# Altium schematic symbol library LimeMicroAltiumLib.SchLib: 590 symbols (part 11 of 13) (continued)
## Qorvo_Duplexers_QPQ1270_QPQ1282_QPQ1297
designator IC?, comment Duplexer
Manufacturer: Qorvo; Supplier 1: Qorvo; Manufacturer Part Number 1: *; Supplier Part Number 1: *
footprint Qorvo_QPQ_duplexer (QPQ1270, QPQ1282, QPQ1297 BAW duplexers)
pins: 1 DL (io), 2 GND, 3 UL (io), 4 GND, 5 GND, 6 ANT (io), 7 GND, 8 GND, 9 GND

## QPA4563A_RF_amplifier
designator IC?, comment QPA4563A
Part Description: RF Amplifier DC-3.5GHZ NF 2.5dB Gain 20.4dB; Manufacturer: Qorvo; Manufacturer Part Number 1: QPA4563ATR7; Supplier 1: Mouser; Supplier Part Number 1: 772-QPA4563ATR7; Stock 1: 25830; Pricing 1: 1=2,72000, 10=2,72000, 50=1,97000, 100=1,60000, 1000=0,89000, 10000=0,88700 (USD); RoHS: Yes; RoHS Compliant: Yes
footprint QPA4563ATR7_SOT363-6
pins: 1 GND, 2 GND, 3 RF IN (in), 4 GND, 5 GND, 6 RF OUT/BIAS (out)

## QPA9119
designator IC?
0.5W High Linearity Amplifier; Manufacturer: Qorvo; Part Description: 0.5W High Linearity Amplifier; Manufacturer Part Number 1: QPA9119; Supplier 1: Qorvo; Supplier Part Number 1: QPA9119
footprint QPA9119_QFN3X3-16 (Quad Flat No Lead, Plastic; 16 Terminals; Body 3 x 3 mm; Pitch 0.5 mm)
pins: 1 NC hidden, 2 RF_IN (in), 3 RF_IN (in), 4 NC hidden, 5 NC hidden, 6 NC hidden, 7 NC hidden, 8 NC hidden, 9 NC hidden, 10 RF_OUT (out), 11 RF_OUT (out), 12 NC hidden, 13 NC hidden, 14 NC hidden, 15 IREF (power), 16 NC hidden, PAD GND

## QPA9426
designator IC?
Manufacturer Part Number 1: QPA9426SR; Part Description: RF Amplifier 2.5-2.7GHz Gain 34dB PAE 14%; Supplier Part Number 1: 772-QPA9426SR; Supplier 1: Mouser
footprint QPA9426_SMD-14
pins: 1 Vref (in), 2 GND, 3 GND, 4 VCC1 (power), 5 RFin (in), 6 GND, 7 NC, 8 GND, 9 GND, 10 GND, 11 VCC2 (power), 12 RFout (out), 13 GND, 14 GND, PAD RF/DC GND

## QPB9337TR13
designator IC?, comment QPB9337
RF Front End 1.8-3.8 GHz Dual Channel Switch LNA Module; Manufacturer: Qorvo; Manufacturer Part Number 1: QPB9337TR13; Supplier 1: Mouser; Stock 1: 200; Pricing 1: 1 = 28,65000, 10 = 28,65000, 50 = 21,86000, 100 = 17,07000, 1000 = 17,07000, 10000 = 17,07000 (USD); Supplier Part Number 1: 772-QPB9337TR13; Part Description: RF Front End 1.8-3.8 GHz Dual Channel Switch LNA Module
footprint QPB9337_QFN32
part A pins: 2 RX-M (out), 7 RX-D (out), 9 BP-D (in), 12 EN-D (in), 16 ANT-D (in), 18 TX-D (out), 23 TX-M (out), 25 ANT-M (in), 29 EN-M (in), 32 BP-M (in)
part B pins: 1 VDD2-M (power), 3 GND, 4 GND, 5 GND, 6 GND, 8 VDD2-D (power), 10 GND, 11 VDD1-D (power), 13 GND, 14 GND, 15 GND, 17 GND, 19 VDD-D (power), 20 GND, 21 GND, 22 VDD-M (power), 24 GND, 26 GND, 27 GND, 28 GND, 30 VDD1-M (power), 31 GND, 32 PAD
part A text: LNA-M; LNA-D

## RAKON_E8231LF_E6982LF
designator XO?, comment E6982LF
Part Description: 26MHz E6982LF Small Cell TCVCXO, w EN and VC, L x W: 5.0 x 3.2 mm nom., H: 2.1 mm max. (6 pad); Manufacturer: Rakon; Manufacturer Part Number 1: E6982LF; Supplier Part Number 1: E6982LF; Supplier 1: Rakon
footprint RAKON_E8231LF_E6982LF (RAKON RTX5032A 40MHz Filter enabled, with VC, 10pin 5mm x 3.2mm)
pins: 1 DNC/VC (in), 2 GND, 3 DNC/VREF/VTEMP (in), 4 RF OUT (out), 5 VCC (power), 6 EN (in)

## Rakon_RTX5032A
designator XO?, comment RTX5032A, 40MHz, w VC, w Filter
Part Description: RTX5032A 40MHz, High performance TCXO, With VC, Filter Enabled, 10-pin 5mm x 3.2 mm x 1.65 mm package; Manufacturer: Rakon; Manufacturer Part Number 1: RTX5032A; Supplier Part Number 1: RTX5032A; Supplier 1: RAKON
footprint RAKON_RTX5032A (RAKON RTX5032A 40MHz Filter enabled, without VC, 10pin)
pins: 1 VCO (in), 2 NC, 3 NC, 4 GND, 5 NC, 6 RF OUT (out), 7 VC FILTER (in), 8 NC, 9 VCC (power), 10 NC

## Raspberry_RPI-COMPUTE3
designator PC?, comment RPI-COMPUTE3  (mechanical)
Part Description: RPI-COMPUTE3 -  Development Kit, Raspberry Pi Compute Module 3, DDR2-SODIMM Mechanically Compatible SoM, 1GB RAM; Manufacturer: RASPBERRY-PI; Manufacturer Part Number 1: RPI-COMPUTE3; Supplier 1: Farnell; Supplier Part Number 1: 2675716

## RBP-140+
designator IC?
Manufacturer: Minicircuits; Part Description: 130 to 150 MHz 50R bandpass filter; Supplier 1: Minicircuits; Supplier Part Number 1: RBP-140+; Manufacturer Part Number 1: RBP-140+
footprint RBP-140+ (saw filter, case style GP731)
pins: 1 GND, 2 Input (in), 3 GND, 4 GND, 5 GND, 6 Output (out), 7 GND, 8 GND

## RCBT-63+
designator IC?
Surface mount bias-tee, wideband; Manufacturer_Name: Mini-Circuits; Manufacturer_Part_Number: RCBT-63+; Supplier Part Number 1: RCBT-63+; Supplier 1: Mini-Circuits; Part Description: Surface mount bias-tee, wideband
pins: 1 DC (io), 2 NC, 3 RF (io), 4 RF&DC (io), 5 NC, 6 NC

## RCIL05A_LRF_isolator
designator IC?, comment RCIL05AL
Manufacturer: RFC; Part Description: RF isolator for LTE band, SMD, 5mm x 5.15mm; Manufacturer Part Number 1: RCIL05AL; Supplier Part Number 1: *; Supplier 1: *
footprint RCIL05AL_RF_isolator
pins: 1 G, 2 G, 3 P1 (in), 4 P2 (out), 5 G, 6 G, PAD
text: Port1; Port2

## RCIL05AL_L_P1toP2_RF_isolator
designator IC?, comment RCIL05AL
Manufacturer: RFC; Part Description: RF isolator for LTE band, SMD, 5mm x 5.15mm; Manufacturer Part Number 1: RCIL05AL; Supplier Part Number 1: *; Supplier 1: *
footprint RCIL05AL_P1toP2_RF_isolator
pins: 1 G, 2 G, 3 P1 (in), 4 P2 (out), 5 G, 6 G, PAD
text: Port1; Port2

## RCIL05AL_R_P2toP1_RF_isolator
designator IC?, comment RCIL05AL
Manufacturer: RFC; Part Description: RF isolator for LTE band, SMD, 5mm x 5.15mm; Manufacturer Part Number 1: RCIL05AL; Supplier Part Number 1: *; Supplier 1: *
footprint RCIL05AL_P2toP1_RF_isolator
pins: 1 G, 2 G, 3 P1 (out), 4 P2 (in), 5 G, 6 G, PAD
text: Port2; Port1

## Res_0201
designator R?
value: *
pins: 1, 2

## Res_0402
designator R?
Value: *
footprint RES0402 (Chip Resistor, Body 1.0x0.5mm, EIA 0402, IPC Medium Density)
pins: 1, 2

## Res_0603
designator R?
Value: *
footprint RES0603 (Chip Resistor, Body 1.6x0.8mm, 0603, IPC Medium Density)
pins: 1, 2

## Res_0805
designator R?
Value: *
footprint RES0805 (Chip Resistor, Body 2.0x1.2mm, 0805, IPC Medium Density)
pins: 1, 2

## ResArray_0802
designator R?, comment 22R
Temperature Coefficient: ±200ppm/°C; Tolerance: ±5%; Supplier 1: Digi-Key; Supplier Part Number 1: YC124J-22TR-ND; Package / Case: 0804, Convex, Long Side Terminals; Value: 22R
footprint ChipResistorArray (Chip Array, Flat, 8-Leads, Pitch 0,60mm,  Body 2,05x1,05mm,  IPC Medium Density)
part A pins: 1, 2
part B pins: 3, 4
part C pins: 5, 6
part D pins: 7, 8

## ResArray_0802v2
designator R?, comment 22R
Manufacturer Part Number 1: YC124-JR-0722RL; Temperature Coefficient: ±200ppm/°C; Tolerance: ±5%; Supplier 1: Digi-Key; Supplier Part Number 1: YC124J-22TR-ND; Package / Case: 0804, Convex, Long Side Terminals; Value: 22R
footprint ChipResistorArray (Chip Array, Flat, 8-Leads, Pitch 0,60mm,  Body 2,05x1,05mm,  IPC Medium Density)
pins: 1, 2, 3, 4, 5, 6, 7, 8

## RF_circulator_CCW
designator HY?
footprint RF_circulator_CCW
pins: GND, P1 (power), P2 (power), P3 P1 (power)
text: CCW

## RF_circulator_CW
designator HY?
footprint RF_circulator_CW
pins: GND, P1 (power), P2 (power), P3 P1 (power)
text: CW

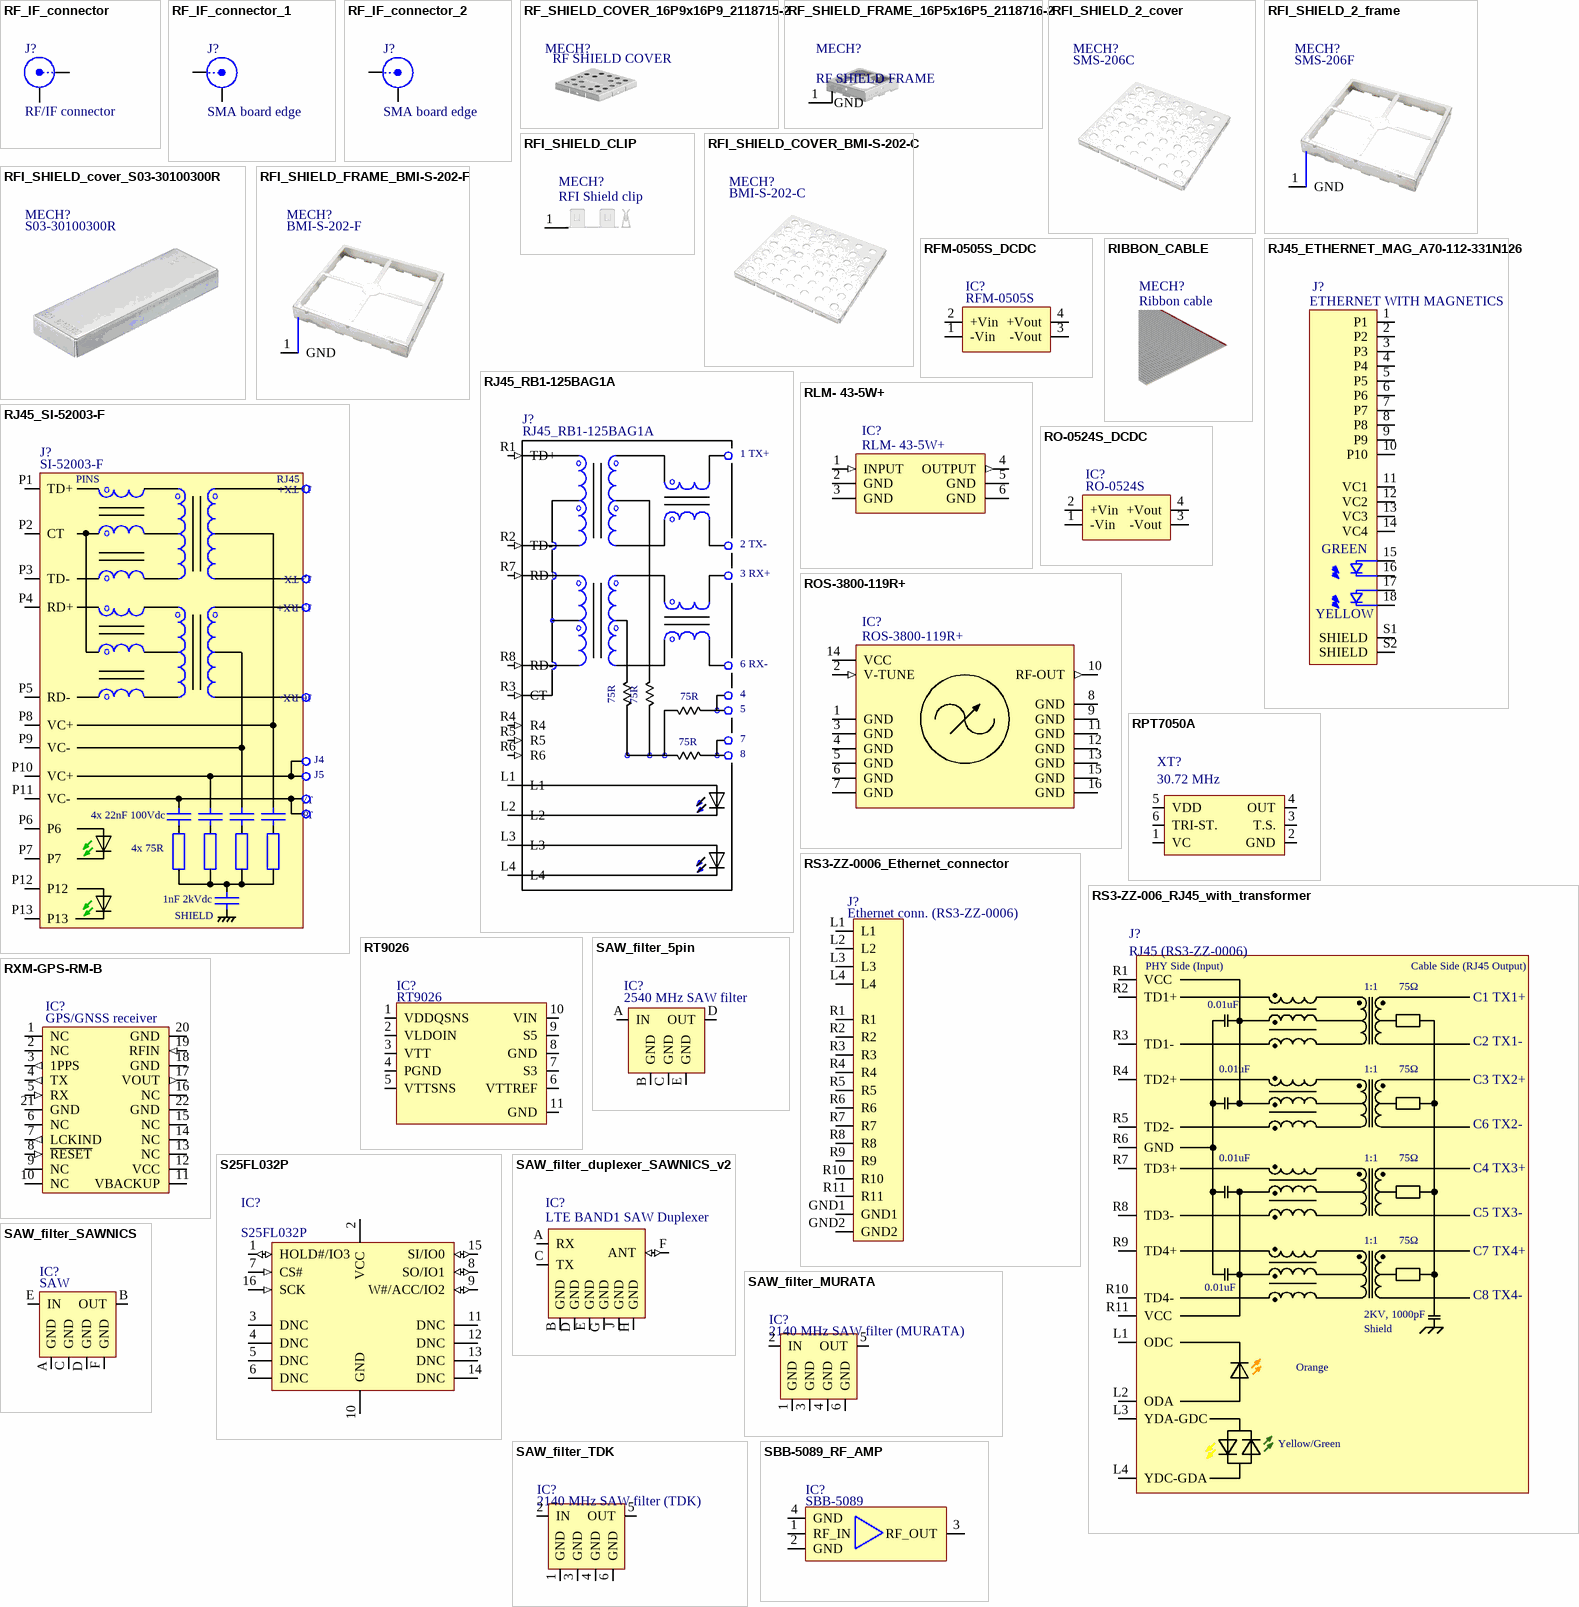
[diagram p62: symbols RF_IF_connector to SBB-5089_RF_AMP]

## RF_IF_connector
designator J?, comment RF/IF connector
footprint MMCX_conn
pins: 1 X, 2 Y

## RF_IF_connector_1
designator J?, comment SMA board edge
CONN SMA JACK STR 50OHM EDGE MNT; Manufacturer: RF Solutions; Manufacturer Part Number 1: CON-SMA-EDGE-S; Part Description: SMA Connector Jack, Female Socket Board Edge, End Launch Solder; Connector Type: Jack, Female Socket; Contact Termination: Solder; Supplier 1: Digi-Key; Supplier Part Number 1: CON-SMA-EDGE-S-ND; RoHS: RoHS Compliant; Category: Connectors, Interconnects; Stock 1: 1751; Pricing 1: 1=2.1 (USD); Packaging: -; Part Status: Active; Connector Style: SMA; Shield Termination: Solder; Impedance: -; Mounting Type: Board Edge, End Launch; Mounting Feature: -; Cable Group: -; Fastening Type: Threaded; Frequency - Max: -; Features: -; Housing Color: -; Ingress Protection: -; Includes: -; Body Material: -; Body Finish: -; Center Contact Plating: -; Dielectric Material: -; Operating Temperature: -; Center Contact Material: -; Voltage Rating: -; Mating Cycles: -; Insertion Loss: -; ComponentLink1URL: http://media.digikey.com/pdf/Data%20Sheets/RF%20Solutions%20PDFs/CON-SMA-EDGE.pdf; ComponentLink1Description: http://media.digikey.com/pdf/Data%20Sheets/RF%20Solutions%20PDFs/CON-SMA-EDGE.pdf
footprint MMCX_UFL_conn_u
footprint SMA_connector_board_edge_SM
footprint MMCX_UFL_conn_V4_M
pins: 1 X, 2 Y

## RF_IF_connector_2
designator J?, comment SMA board edge
CONN SMA JACK STR 50OHM EDGE MNT; Manufacturer: RF Solutions; Manufacturer Part Number 1: CON-SMA-EDGE-S; Part Description: SMA Connector Jack, Female Socket Board Edge, End Launch Solder; Connector Type: Jack, Female Socket; Contact Termination: Solder; Supplier 1: Digi-Key; Supplier Part Number 1: CON-SMA-EDGE-S-ND; RoHS: RoHS Compliant; Category: Connectors, Interconnects; Stock 1: 1751; Pricing 1: 1=2.1 (USD); Packaging: -; Part Status: Active; Connector Style: SMA; Shield Termination: Solder; Impedance: -; Mounting Type: Board Edge, End Launch; Mounting Feature: -; Cable Group: -; Fastening Type: Threaded; Frequency - Max: -; Features: -; Housing Color: -; Ingress Protection: -; Includes: -; Body Material: -; Body Finish: -; Center Contact Plating: -; Dielectric Material: -; Operating Temperature: -; Center Contact Material: -; Voltage Rating: -; Mating Cycles: -; Insertion Loss: -; ComponentLink1URL: http://media.digikey.com/pdf/Data%20Sheets/RF%20Solutions%20PDFs/CON-SMA-EDGE.pdf; ComponentLink1Description: http://media.digikey.com/pdf/Data%20Sheets/RF%20Solutions%20PDFs/CON-SMA-EDGE.pdf
footprint MMCX_UFL_conn_u
footprint SMA_connector_board_edge_SM
footprint MMCX_UFL_conn_V4_M
pins: 1 X, 2 Y

## RF_SHIELD_COVER_16P9x16P9_2118715-2
designator MECH?, comment RF SHIELD COVER
Part Description: RF Shield Cover 0.665" (16.90mm) X 0.665" (16.90mm) Vented Surface Mount; Manufacturer: TE Connectivity; Manufacturer Part Number 1: 2118715-2; ComponentLink1URL: https://www.te.com/commerce/DocumentDelivery/DDEController?Action=srchrtrv&DocNm=2118716&DocType=Customer+Drawing&DocLang=English&src-supplier=Digi-Key; ComponentLink1Description: https://www.te.com/commerce/DocumentDelivery/DDEController?Action=srchrtrv&DocNm=2118716&DocType=Customer+Drawing&DocLang=English&src-supplier=Digi-Key; Supplier 1: Digi-Key; Supplier Part Number 1: A126120-ND; Stock 1: 58094; Pricing 1: 1=1,44000, 10=1,28900, 25=1,22400, 100=1,00530, 250=0,93972, 500=0,83046, 1000=0,65562, 2500=0,61191, 5000=0,58132 (USD); RoHS: Yes; ComponentLink2URL: https://www.te.com/commerce/DocumentDelivery/DDEController?Action=srchrtrv&DocNm=2118715&DocType=Customer+Drawing&DocLang=English&src-supplier=Digi-Key; ComponentLink2Description: https://www.te.com/commerce/DocumentDelivery/DDEController?Action=srchrtrv&DocNm=2118715&DocType=Customer+Drawing&DocLang=English&src-supplier=Digi-Key
footprint RF_SHIELD_COVER_16Px916P9_2118715-2

## RF_SHIELD_FRAME_16P5x16P5_2118716-2
designator MECH?, comment RF SHIELD FRAME
Part Description: RF Shield Frame 0.650" (16.50mm) X 0.650" (16.50mm) Surface Mount; Manufacturer: TE Connectivity; Manufacturer Part Number 1: 2118716-2; Supplier 1: Digi-Key; Supplier Part Number 1: A126152CT-ND; Stock 1: 26553; Pricing 1: 1=0,93000, 10=0,81600, 25=0,76680, 100=0,62570, 250=0,58120 (USD); RoHS: Yes; ComponentLink1URL: https://www.te.com/commerce/DocumentDelivery/DDEController?Action=srchrtrv&DocNm=2118716&DocType=Customer+Drawing&DocLang=English&src-supplier=Digi-Key; ComponentLink1Description: https://www.te.com/commerce/DocumentDelivery/DDEController?Action=srchrtrv&DocNm=2118716&DocType=Customer+Drawing&DocLang=English&src-supplier=Digi-Key
footprint RF_SHIELD_FRAME_16P5x16P5_2118716-2 (Footprint not found)
pins: 1 GND

## RFI_SHIELD_2_cover
designator MECH?, comment SMS-206C  (mechanical)
Manufacturer: Leader Tech Inc.; Part Description: RF Shield Cover 1.348" (34.24mm) X 1.472" (37.39mm) Vented Surface Mount; Ventilation: Vented; Supplier 1: Digi-Key; Manufacturer Part Number: SMS-206C; RoHS: RoHS Compliant; Category: RF/IF and RFID; Stock 1: 1529; Pricing 1: 1=0.8, 10=0.703, 25=0.6228, 100=0.5426, 250=0.47224, 500=0.4019, 1000=0.32152, 2500=0.29138, 5000=0.27128 (USD); Packaging: Bulk; Part Status: Active; Type: Cover; Height - Overall: 0.079" (2.01mm); Length - Overall: 1.472" (37.39mm); Width - Overall: 1.348" (34.24mm); Mounting Type: Surface Mount; ComponentLink1URL: https://www.leadertechinc.com/assets/files/EngineeringDrawings/SMS-206.PDF; ComponentLink1Description: https://www.leadertechinc.com/assets/files/EngineeringDrawings/SMS-206.PDF; Supplier Part Number 1: 1798-1188-ND

## RFI_SHIELD_2_frame
designator MECH?, comment SMS-206F
Part Description: RF Shield Frame 1.326" (33.68mm) X 1.450" (36.83mm) Surface Mount; Manufacturer: Leader Tech Inc.; Supplier 1: Digi-Key; Manufacturer Part Number: SMS-206F; RoHS: RoHS Compliant; Category: RF/IF and RFID; Stock 1: 898; Pricing 1: 1=2.97, 10=2.682, 25=2.3948, 100=2.1553 (USD); Packaging: Cut Tape (CT); Part Status: Active; Type: Frame; Height - Overall: 0.200" (5.08mm); Length - Overall: 1.450" (36.83mm); Width - Overall: 1.326" (33.68mm); Ventilation: -; Mounting Type: Surface Mount; ComponentLink1URL: https://www.leadertechinc.com/assets/files/EngineeringDrawings/SMS-206.PDF; ComponentLink1Description: https://www.leadertechinc.com/assets/files/EngineeringDrawings/SMS-206.PDF; Supplier Part Number 1: 1798-1189-1-ND
footprint SHIELD_SMS-206F (RF Shield  Frame+Cover 1.348" (34.24mm) X 1.472" (37.39mm) Vented Surface Mount)
pins: 1 GND

## RFI_SHIELD_CLIP
designator MECH?, comment RFI Shield clip
Manufacturer Part Number 1: S0971-46R; Manufacturer: HARWIN; Part Description: RFI SHIELD CLIP MINI TIN SMD; SVHC: No SVHC (15-Jun-2015); Supplier 1: Farnell; Supplier: Farnell; Length: 5.8; Clip Type: RFI Shield Clip; Clip Diameter: -; Product Range: -; Mounting Hole Dia: -; RoHS: YES; Supplier Part Number 1: 2361677
footprint RFI_SHIELD_CLPS_MINI (RFI SHIELD CLIP MINI TIN SMD, S0971-46R)
pins: 1 GND

## RFI_SHIELD_COVER_BMI-S-202-C
designator MECH?, comment BMI-S-202-C
Part Description: RF Shield Cover 0.668" (16.96mm) X 0.668" (16.96mm) Vent Holes in Pattern Snap Fit; Manufacturer: Laird; ComponentLink1URL: https://www.leadertechinc.com/assets/files/EngineeringDrawings/SMS-206.PDF; ComponentLink1Description: https://www.leadertechinc.com/assets/files/EngineeringDrawings/SMS-206.PDF; Supplier 1: Digi-Key; Supplier Part Number 1: 903-1014-ND; Manufacturer Part Number 1: BMI-S-202-C; Stock 1: 245970; Pricing 1: 1=1,68000, 10=1,51300, 25=1,42760, 100=1,21620, 250=1,14200, 500=0,99924, 1000=0,82795, 2500=0,77085, 5000=0,74230 (USD); RoHS: Yes; Color: Grey; Material: Aluminium; Package Quantity: 1400; Packaging: Bulk; Series: SMT 2 Piece; Length: 16.5mm; Width: 16.5mm; Depth: 3.6mm; ComponentLink2URL: http://www.farnell.com/datasheets/1965028.pdf?src-supplier=Farnell; ComponentLink2Description: http://www.farnell.com/datasheets/1965028.pdf?src-supplier=Farnell; ComponentLink3URL: http://www.mouser.com/ds/2/223/Laird_BMIS_201_210-201562.pdf?src-supplier=Mouser; ComponentLink3Description: http://www.mouser.com/ds/2/223/Laird_BMIS_201_210-201562.pdf?src-supplier=Mouser; ComponentLink4URL: http://www.farnell.com/datasheets/1965028.pdf?src-supplier=Newark; ComponentLink4Description: http://www.farnell.com/datasheets/1965028.pdf?src-supplier=Newark; ComponentLink5URL: http://www.farnell.com/datasheets/1965028.pdf?src-supplier=Element14; ComponentLink5Description: http://www.farnell.com/datasheets/1965028.pdf?src-supplier=Element14; ComponentLink6URL: http://assets.lairdtech.com/home/brandworld/files/Board%20Level%20Shields%20Catalog%20Download.pdf?src-supplier=Digi-Key; ComponentLink6Description: http://assets.lairdtech.com/home/brandworld/files/Board%20Level%20Shields%20Catalog%20Download.pdf?src-supplier=Digi-Key; ComponentLink7URL: http://assets.lairdtech.com/home/brandworld/files/Board%20Level%20Shields%20Catalog%20Download.pdf?src-supplier=Quest; ComponentLink7Description: http://assets.lairdtech.com/home/brandworld/files/Board%20Level%20Shields%20Catalog%20Download.pdf?src-supplier=Quest
footprint BMI-S-202-C_RF_SHIELD_COVER

## RFI_SHIELD_cover_S03-30100300R
designator MECH?, comment S03-30100300R
Part Description: RF Shield CAN 0.394" (10.00mm) X 1.181" (30.00mm) Non-Vented Surface Mount; Manufacturer: Harwin; ComponentLink1URL: https://www.leadertechinc.com/assets/files/EngineeringDrawings/SMS-206.PDF; ComponentLink1Description: https://www.leadertechinc.com/assets/files/EngineeringDrawings/SMS-206.PDF; Supplier 1: Digi-Key; Supplier Part Number 1: 952-S03-30100300RCT-ND; Manufacturer Part Number 1: S03-30100300R; Stock 1: 6493; Pricing 1: 1=1,30000, 10=1,15900, 25=1,10040, 100=0,90390, 250=0,84496 (USD); RoHS: No
footprint SHIELD_S03-30100300R (RF Shield CAN 0.394" (10.00mm) X 1.181" (30.00mm) Non-Vented Surface Mount)

## RFI_SHIELD_FRAME_BMI-S-202-F
designator MECH?, comment BMI-S-202-F
Part Description: RF Shield Frame 0.650" (16.50mm) X 0.650" (16.50mm) Surface Mount; Manufacturer: Laird; ComponentLink1URL: https://www.leadertechinc.com/assets/files/EngineeringDrawings/SMS-206.PDF; ComponentLink1Description: https://www.leadertechinc.com/assets/files/EngineeringDrawings/SMS-206.PDF; Supplier 1: Digi-Key; Supplier Part Number 1: 903-1051-1-ND; Manufacturer Part Number 1: BMI-S-202-F; Stock 1: 239502; Pricing 1: 1=1,94000, 10=1,74100, 25=1,64280, 100=1,39970, 250=1,31428 (USD); RoHS: Yes; Mount: Solder; Material: Aluminium; Color: Grey; Package Quantity: 700; Packaging: Tape and Reel; Length: 16.5mm; Width: 16.5mm; Depth: 3.6mm; Reach SVHC Compliant: Unknown; ComponentLink2URL: https://datasheet.ciiva.com/2799/bmi-s-202-2799404.pdf?src-supplier=Digi-Key; ComponentLink2Description: https://datasheet.ciiva.com/2799/bmi-s-202-2799404.pdf?src-supplier=Digi-Key
footprint BMI-S-202-F_RF_SHIELD_FRAME
pins: 1 GND

## RFM-0505S_DCDC
designator IC?, comment RFM-0505S
Part Description: Isolated Module DC DC Converter 1 Output 5V    200mA  - 5V Input; Manufacturer: Recom; Max Output Voltage: 5V; ComponentLink1URL: https://datasheet.ciiva.com/11836/0900766b80d62039-11836901.pdf?src-supplier=RSComponents; ComponentLink1Description: https://datasheet.ciiva.com/11836/0900766b80d62039-11836901.pdf?src-supplier=RSComponents; ComponentLink2URL: https://datasheet.ciiva.com/2172/ro-2172489.pdf?src-supplier=Digi-Key; ComponentLink2Description: https://datasheet.ciiva.com/2172/ro-2172489.pdf?src-supplier=Digi-Key; ComponentLink3URL: https://datasheet.ciiva.com/16483/ro-16483065.pdf?src-supplier=Future+Electronics; ComponentLink3Description: https://datasheet.ciiva.com/16483/ro-16483065.pdf?src-supplier=Future+Electronics; ComponentLink4URL: https://datasheet.ciiva.com/8072/ro-8072364.pdf?src-supplier=Element14; ComponentLink4Description: https://datasheet.ciiva.com/8072/ro-8072364.pdf?src-supplier=Element14; Supplier 1: Digi-Key; Manufacturer Part Number 1: RFM-0505S; Stock 1: 11282; Pricing 1: 1=1,40000, 5=1,38000, 10=1,36000, 42=1,32000, 84=1,28000, 126=1,24000, 252=1,20000, 504=1,12000 (USD); RoHS: No; Weight: 1.4g; Length: 11.5mm; Height: 10mm; Width: 6mm; ComponentLink5URL: https://www.recom-power.com/pdf/Econoline/RFM.pdf?src-supplier=Digi-Key; ComponentLink5Description: https://www.recom-power.com/pdf/Econoline/RFM.pdf?src-supplier=Digi-Key; Supplier Part Number 1: 945-3159-ND
footprint RFM-0505S_4SIP (24V 1W DCDC converter module)
pins: 1 -Vin, 2 +Vin, 3 -Vout, 4 +Vout

## RIBBON_CABLE
designator MECH?, comment Ribbon cable  (mechanical)
Manufacturer: 3M; Part Description: Flat Ribbon Cable Gray 40 Conductors 0.050" (1.27mm) Flat Cable 1.00' (304.80mm); Conductor Material: Copper; Wire/Cable Type: Flat,Round; Number of Conductors: 40; Voltage Rating: 300V; Shielding: Unshielded; Impedance: 172R; Wire/Cable Gauge: 28AWG; Pitch: 0.05inch; Cable Length: 91.44m; Cable Pitch: 1.27mm; Supplier 1: Digikey; Manufacturer Part Number 1: 3365/40-300; Stock 1: 20; Pricing 1: 1 = 7,24000, 5 = 5,99200, 10 = 5,52400, 25 = 4,95760, 50 = 4,56720, 100 = 4,19630 (USD); Mount: Cable; Case/Package: 300; Weight: 16.3lb; Color: Grey,Red; Contact Plating: Tin; Insulation Material: Polyvinyl; Min Operating Temperature: -20°C; Max Operating Temperature: 105°C; Packaging: Roll; Length: 300foot; Depth: 50.8mm; ComponentLink1URL: http://multimedia.3m.com/mws/media/22052O/3mtm-round-conductor-flat-cable-050in-3365-series-ts0080.pdf; ComponentLink1Description: http://multimedia.3m.com/mws/media/22052O/3mtm-round-conductor-flat-cable-050in-3365-series-ts0080.pdf; ComponentLink2URL: http://datasheet.octopart.com/3365/40-300-3M-datasheet-155274.pdf; ComponentLink2Description: http://datasheet.octopart.com/3365/40-300-3M-datasheet-155274.pdf; ComponentLink3URL: http://datasheet.octopart.com/3365/40-300-3M-datasheet-8453687.pdf; ComponentLink3Description: http://datasheet.octopart.com/3365/40-300-3M-datasheet-8453687.pdf; Supplier Part Number 1: 3M157807-5-ND

## RJ45_ETHERNET_MAG_A70-112-331N126
designator J?, comment ETHERNET WITH MAGNETICS
MagJack A70-112-331N126 or LINK-PP LPJG0926HENL; Part Description: A70-112-331N126 Tab Down Ethernet Magnetic RJ45 Connector LPJG0926HENL With POE +; Manufacturer Part Number 1: LPJG0926HENL; Supplier Part Number 1: LPJG0926HENL; Supplier: Link-PP; Manufacturer: Link-PP
footprint RJ45_ETHERNET_MAG_A70-112-331N126
pins: 1 P1, 2 P2, 3 P3, 4 P4, 5 P5, 6 P6, 7 P7, 8 P8, 9 P9, 10 P10, 11 VC1, 12 VC2, 13 VC3, 14 VC4, 15 G_A, 16 G_K, 17 Y_A, 18 Y_K, S1 SHIELD, S2 SHIELD
text: GREEN; YELLOW

## RJ45_RB1-125BAG1A
designator J?
Part Description: 1 Port RJ45 Magjack Connector Through Hole 10/100 Base-T, AutoMDIX; Manufacturer: WIZnet; Connector Type: RJ45; LED Color: Green - Yellow; Number of Cores per Jack: 4; Shielding: Shielded, EMI Finger; Tab Direction: Down; Shield Material: Stainless Steel; Supplier 1: Digi-Key; Manufacturer Part Number 1: RB1-125BAG1A; RoHS: RoHS Compliant; Category: Connectors, Interconnects; Stock 1: 12683; Pricing 1: 1=2.55, 10=2.448, 25=2.244, 50=2.142, 100=2.04, 250=1.785, 500=1.734, 1000=1.56 (USD); Packaging: Bulk; Part Status: Active; Applications: 10/100 Base-T, AutoMDIX; Mounting Type: Through Hole; Orientation: 90° Angle (Right); Termination: Solder; Height Above Board: 0.525" (13.33mm); Features: Board Lock; Contact Material: Phosphor Bronze; Contact Finish: Gold; Operating Temperature: 0°C ~ 70°C; Contact Finish Thickness: Flash; Housing Material: Thermoplastic; ComponentLink1URL: http://www.shopwiznet.com/lanotattachments/download/file/id/95/store/1/; ComponentLink1Description: http://www.shopwiznet.com/lanotattachments/download/file/id/95/store/1/; Supplier Part Number 1: 1278-1011-ND
footprint RBP-140+ (saw filter, case style GP731)
pins: L1, L2, L3, L4, R1 TD+ (in), R2 TD- (in), R3 CT (in), R4 (in), R5 (in), R6 (in), R7 RD+ (in), R8 RD- (in)
text: 1 TX+; 2 TX-; 3 RX+; 6 RX-; 75R; 5; 7; 8

## RJ45_SI-52003-F
designator J?, comment SI-52003-F
Part Description: 1 Port RJ45 Magjack Connector Through Hole 10/100 Base-T, AutoMDIX, Power over Ethernet (PoE); Manufacturer: Stewart Connector; Connector Type: RJ45; LED Color: Green - Green; Number of Cores per Jack: 4; Shielding: Shielded, EMI Finger; Tab Direction: Up; Shield Material: Copper Alloy; Supplier 1: Digi-Key; Manufacturer Part Number 1: SI-52003-F; RoHS: RoHS Compliant; Category: Connectors, Interconnects; Stock 1: 11085; Pricing 1: 1=5.33, 10=5.112, 25=4.686, 50=4.473, 100=4.26, 250=3.72752, 500=3.621, 1000=3.0885, 2500=2.8755 (USD); Packaging: Tray; Part Status: Active; Applications: 10/100 Base-T, AutoMDIX, Power over Ethernet (PoE); Mounting Type: Through Hole; Orientation: 90° Angle (Right); Termination: Solder; Height Above Board: 0.550" (13.97mm); Features: Board Guide; Contact Material: Copper Alloy; Contact Finish: Gold; Operating Temperature: -; Contact Finish Thickness: 50.0µin (1.27µm); Housing Material: Thermoplastic; ComponentLink1URL: https://belfuse.com/resources/StewartConnector/SI-52003-F.pdf; ComponentLink1Description: https://belfuse.com/resources/StewartConnector/SI-52003-F.pdf; Supplier Part Number 1: 380-1119-ND
footprint RJ45_SI-52003-F
pins: P1 TD+, P2 CT, P3 TD-, P4 RD+, P5 RD-, P6, P7, P8 VC+, P9 VC-, P10 VC+, P11 VC-, P12, P13
text: J1 TX+; PINS; J2 TX-; J3 RX+; J6 RX-; J4; J5; J7; J8; 4x 22nF 100Vdc; 4x 75R; 1nF 2kVdc; SHIELD

## RLM- 43-5W+
designator IC?
Limiter: 50Ω, Broadband, 20 to 4000 MHz; Manufacturer: Mini-Circuits; Supplier Part Number 1: RLC-43-5W+; Supplier 1: Mini-Circuits; Part Description: Limiter: 50Ω, Broadband, 20 to 4000 MHz; Manufacturer Part Number 1: RLM-43-5W+
footprint RLM-43-5W_TT1224
pins: 1 INPUT (in), 2 GND, 3 GND, 4 OUTPUT (out), 5 GND, 6 GND